# Altium footprint library 9-Pcblib_Con.PcbLib: 266 footprints (part 2 of 17)
Each footprint in its own frame and in the unit in brackets; x right, y up, seen from the top. Pads: shape width x height; smd on the part's side, far side on the other; paste and mask are expansions set on the pad; w line width, h text height; cw(c..) or ccw(c..) is an arc to the next point about the centre after c.
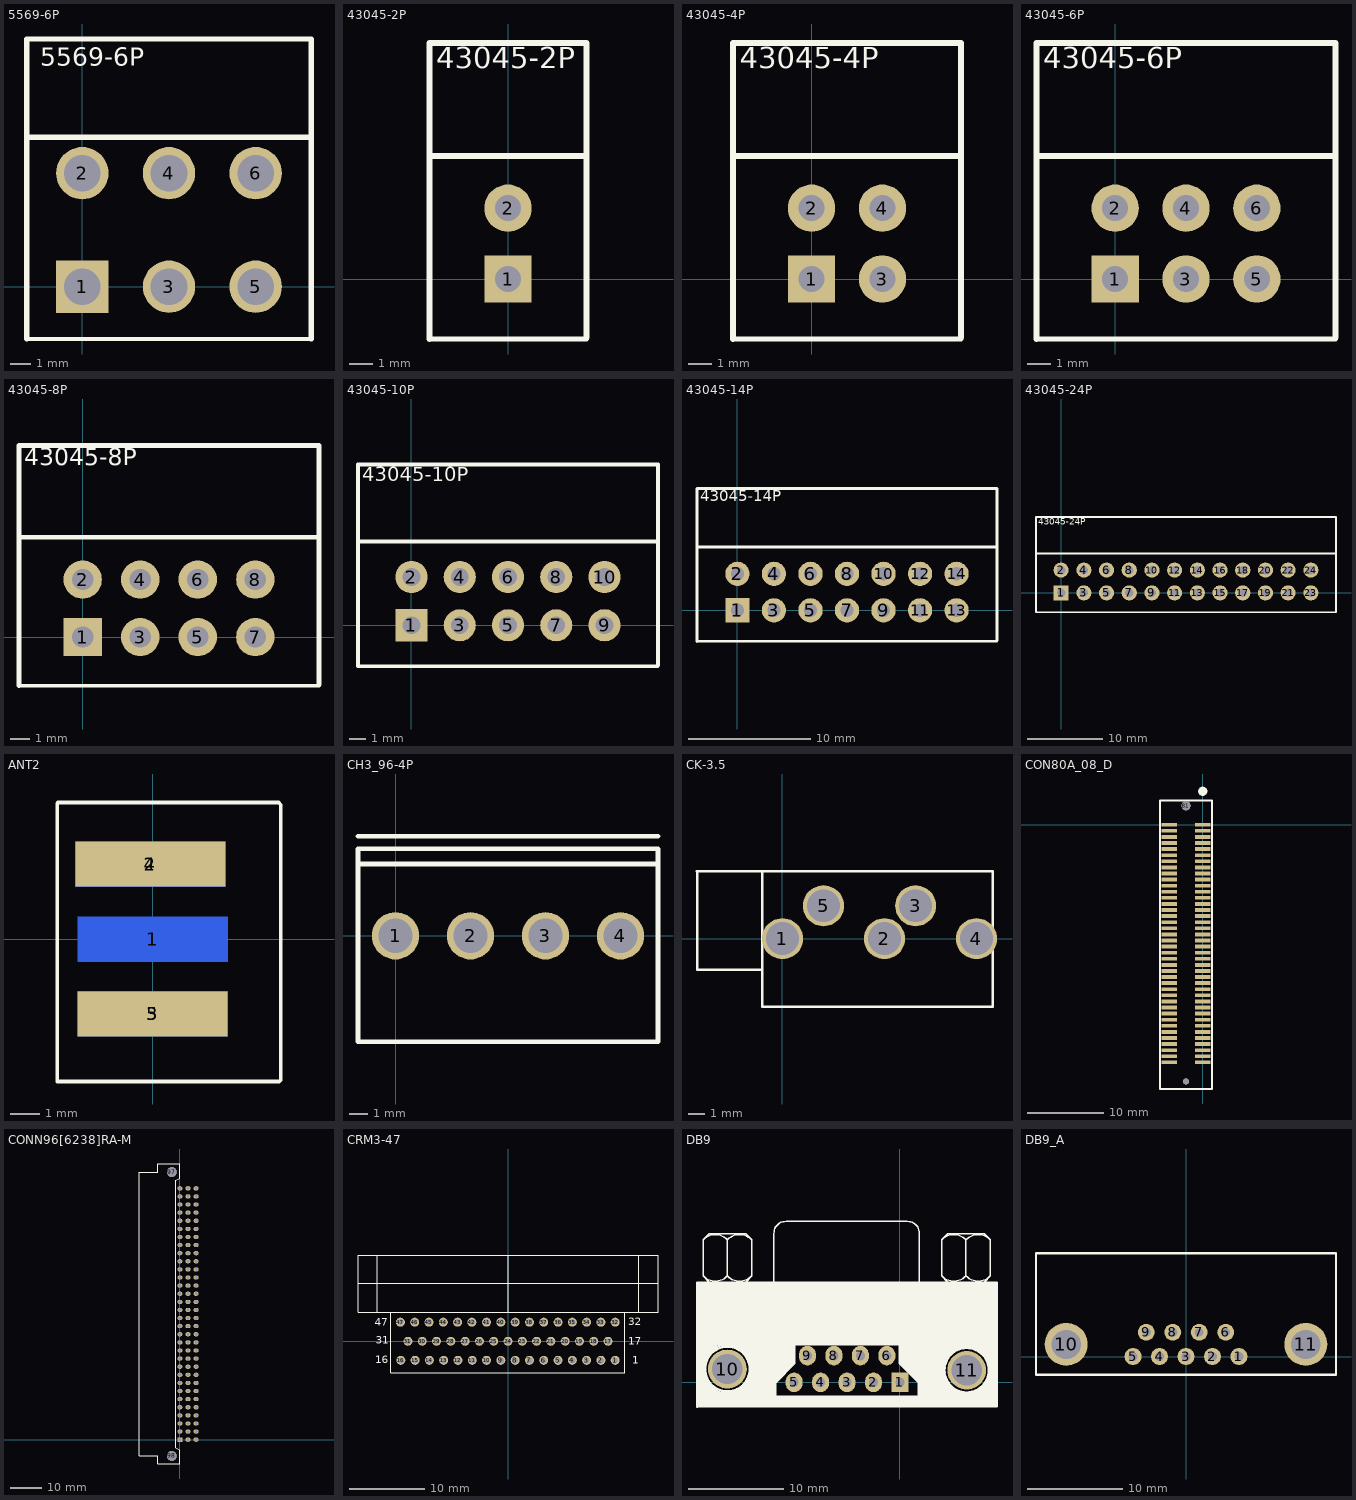
[diagram p1: the footprints below, top view; thin cyan lines are the x and y axes]

## 5569-6P [mm]
height 20
pads (6):
  rect 2.54x2.54 hole 1.778: 1(0,0)
  round 2.54 hole 1.778: 2(0,5.5) 3(4.2,0) 4(4.2,5.5) 5(8.4,0) 6(8.4,5.5)
Top Overlay:
  lines w0.2: -2.7,-2.54 11.1,-2.54
  lines w0.254: -2.7,-2.54 -2.7,12 11.1,12 11.1,-2.54 ; -2.7,7.239 10.973,7.239
  text "5569-6P" at -2.032,10.414 h1.52

## 43045-2P [mm]
height 25
pads (2):
  rect 2x2 hole 1.1: 1(0,0)
  round 2 hole 1.1: 2(0,3)
Top Overlay:
  lines w0.2: -3.325,-2.54 3.325,-2.54
  lines w0.254: -3.325,-2.54 -3.325,10 3.325,10 3.325,-2.475 ; -3.325,5.207 3.325,5.207
  text "43045-2P" at -3.048,8.636 h1.52

## 43045-4P [mm]
height 25
pads (4):
  rect 2x2 hole 1.1: 1(0,0)
  round 2 hole 1.1: 2(0,3) 3(3,0) 4(3,3)
Top Overlay:
  lines w0.2: -3.325,-2.54 6.325,-2.54
  lines w0.254: -3.325,-2.54 -3.325,10 6.325,10 6.325,-2.475 ; -3.325,5.207 6.325,5.207
  text "43045-4P" at -3.048,8.636 h1.52

## 43045-6P [mm]
height 25
pads (6):
  rect 2x2 hole 1.1: 1(0,0)
  round 2 hole 1.1: 2(0,3) 3(3,0) 4(3,3) 5(6,0) 6(6,3)
Top Overlay:
  lines w0.2: -3.325,-2.54 9.325,-2.54
  lines w0.254: -3.325,-2.54 -3.325,10 9.325,10 9.325,-2.475 ; -3.325,5.207 9.325,5.207
  text "43045-6P" at -3.048,8.636 h1.52

## 43045-8P [mm]
height 25
pads (8):
  rect 2x2 hole 1.1: 1(0,0)
  round 2 hole 1.1: 2(0,3) 3(3,0) 4(3,3) 5(6,0) 6(6,3) 7(9,0) 8(9,3)
Top Overlay:
  lines w0.2: -3.325,-2.54 12.325,-2.54
  lines w0.254: -3.325,-2.54 -3.325,10 12.325,10 12.325,-2.475 ; -3.325,5.207 12.325,5.207
  text "43045-8P" at -3.048,8.636 h1.52

## 43045-10P [mm]
height 25
pads (10):
  rect 2x2 hole 1.1: 1(0,0)
  round 2 hole 1.1: 2(0,3) 3(3,0) 4(3,3) 5(6,0) 6(6,3) 7(9,0) 8(9,3) 9(12,0) 10(12,3)
Top Overlay:
  lines w0.2: -3.325,-2.54 15.325,-2.54
  lines w0.254: -3.325,-2.54 -3.325,10 15.325,10 15.325,-2.475 ; -3.325,5.207 15.325,5.207
  text "43045-10P" at -3.048,8.636 h1.52

## 43045-14P [mm]
height 25
pads (14):
  rect 2x2 hole 1.1: 1(0,0)
  round 2 hole 1.1: 2(0,3) 3(3,0) 4(3,3) 5(6,0) 6(6,3) 7(9,0) 8(9,3) 9(12,0) 10(12,3) 11(15,0) 12(15,3) 13(18,0) 14(18,3)
Top Overlay:
  lines w0.2: -3.325,-2.54 21.325,-2.54
  lines w0.254: -3.325,-2.54 -3.325,10 21.325,10 21.325,-2.475 ; -3.325,5.207 21.325,5.207
  text "43045-14P" at -3.048,8.636 h1.52

## 43045-24P [mm]
height 25
pads (24):
  rect 2x2 hole 1.1: 1(0,0)
  round 2 hole 1.1: 2(0,3) 3(3,0) 4(3,3) 5(6,0) 6(6,3) 7(9,0) 8(9,3) 9(12,0) 10(12,3) 11(15,0) 12(15,3) 13(18,0) 14(18,3) 15(21,0) 16(21,3) 17(24,0) 18(24,3) 19(27,0) 20(27,3) 21(30,0) 22(30,3) 23(33,0) 24(33,3)
Top Overlay:
  lines w0.2: -3.325,-2.54 36.325,-2.54
  lines w0.254: -3.325,-2.54 -3.325,10 36.325,10 36.325,-2.475 ; -3.325,5.207 36.325,5.207
  text "43045-24P" at -3.048,8.636 h1.52

## ANT2 [mil]
pads (5):
  rect 200x60 smd far side: 1(0,0) 4(-3,100) 5(0,-100)
  rect 200x60 smd: 2(-3,100) 3(0,-100)
Top Overlay:
  lines w5: 171,-186 171,-157 ; 171,-183 171,-188 169,-190 -127,-190 -127,-159 -127,181 -126,182 168,182 171,179 171,-159

## CH3_96-4P [mm]
pads (4):
  round 2.5 hole 1.8: 1(0,0) 2(3.96,0) 3(7.92,0) 4(11.88,0)
Top Overlay:
  lines w0.254: -1.98,3.787 13.86,3.787 ; -1.98,5.26 13.86,5.26 ; -1.98,-5.6 13.86,-5.6 13.86,4.6 -1.98,4.6 -1.98,-5.6
3D body: height 13.8, standoff -3.6, extent -1.926,-5.664 13.914,4.736

## CK-3.5 [mm]
pads (5):
  round 2.5 hole 2: 1(0,0) 2(6.2,0) 3(8.1,2) 4(11.8,0) 5(2.5,2)
Top Overlay:
  lines w0.152: -5.2,4.1 -1.2,4.1 12.8,4.1 ; -5.182,4.1 -5.182,-1.9 -1.3,-1.9 -1.295,-1.905 ; -1.219,-4.14 12.8,-4.14 12.8,4.076 12.776,4.1 ; -1.219,-4.1 -1.219,4.1

## CON80A_08_D [mm]
pads (82):
  rect 2x0.5 smd: 1(0,0) 2(-4.4,0) 3(0,-0.8) 4(-4.4,-0.8) 5(0,-1.6) 6(-4.4,-1.6) 7(0,-2.4) 8(-4.4,-2.4) 9(0,-3.2) 10(-4.4,-3.2) 11(0,-4) 12(-4.4,-4) 13(0,-4.8) 14(-4.4,-4.8) 15(0,-5.6) 16(-4.4,-5.6) 17(0,-6.4) 18(-4.4,-6.4) 19(0,-7.2) 20(-4.4,-7.2) 21(0,-8) 22(-4.4,-8) 23(0,-8.8) 24(-4.4,-8.8) 25(0,-9.6) 26(-4.4,-9.6) 27(0,-10.4) 28(-4.4,-10.4) 29(0,-11.2) 30(-4.4,-11.2) 31(0,-12) 32(-4.4,-12) 33(0,-12.8) 34(-4.4,-12.8) 35(0,-13.6) 36(-4.4,-13.6) 37(0,-14.4) 38(-4.4,-14.4) 39(0,-15.2) 40(-4.4,-15.2) 41(0,-16) 42(-4.4,-16) 43(0,-16.8) 44(-4.4,-16.8) 45(0,-17.6) 46(-4.4,-17.6) 47(0,-18.4) 48(-4.4,-18.4) 49(0,-19.2) 50(-4.4,-19.2) 51(0,-20) 52(-4.4,-20) 53(0,-20.8) 54(-4.4,-20.8) 55(0,-21.6) 56(-4.4,-21.6) 57(0,-22.4) 58(-4.4,-22.4) 59(0,-23.2) 60(-4.4,-23.2) 61(0,-24) 62(-4.4,-24) 63(0,-24.8) 64(-4.4,-24.8) 65(0,-25.6) 66(-4.4,-25.6) 67(0,-26.4) 68(-4.4,-26.4) 69(0,-27.2) 70(-4.4,-27.2) 71(0,-28) 72(-4.4,-28) 73(0,-28.8) 74(-4.4,-28.8) 75(0,-29.6) 76(-4.4,-29.6) 77(0,-30.4) 78(-4.4,-30.4) 79(0,-31.2) 80(-4.4,-31.2)
  round 1.2 hole 1.2 unplated: 81(-2.2,2.5)
  round 0.8 hole 0.8 unplated: 82(-2.2,-33.7)
Top Overlay:
  circle w0.6: c0,4.392 r0.3
  lines w0.254: -5.6,-34.7 -5.6,3.2 1.2,3.2 1.2,-34.7 -5.6,-34.7

## CONN96[6238]RA-M [mil]
pads (98):
  round 120 hole 120 unplated: 97(-100,3300) 98(-100,-200)
  rect 62x51.18 hole 42: A1(0,0)
  oval 62x51.18 hole 42: A2(0,100) A3(0,200) A4(0,300) A5(0,400) A6(0,500) A7(0,600) A8(0,700) A9(0,800) A10(0,900) A11(0,1000) A12(0,1100) A13(0,1200) A14(0,1300) A15(0,1400) A16(0,1500) A17(0,1600) A18(0,1700) A19(0,1800) A20(0,1900) A21(0,2000) A22(0,2100) A23(0,2200) A24(0,2300) A25(0,2400) A26(0,2500) A27(0,2600) A28(0,2700) A29(0,2800) A30(0,2900) A31(0,3000) A32(0,3100) B1(100,0) B2(100,100) B3(100,200) B4(100,300) B5(100,400) B6(100,500) B7(100,600) B8(100,700) B9(100,800) B10(100,900) B11(100,1000) B12(100,1100) B13(100,1200) B14(100,1300) B15(100,1400) B16(100,1500) B17(100,1600) B18(100,1700) B19(100,1800) B20(100,1900) B21(100,2000) B22(100,2100) B23(100,2200) B24(100,2300) B25(100,2400) B26(100,2500) B27(100,2600) B28(100,2700) B29(100,2800) B30(100,2900) B31(100,3000) B32(100,3100) C1(200,0) C2(200,100) C3(200,200) C4(200,300) C5(200,400) C6(200,500) C7(200,600) C8(200,700) C9(200,800) C10(200,900) C11(200,1000) C12(200,1100) C13(200,1200) C14(200,1300) C15(200,1400) C16(200,1500) C17(200,1600) C18(200,1700) C19(200,1800) C20(200,1900) C21(200,2000) C22(200,2100) C23(200,2200) C24(200,2300) C25(200,2400) C26(200,2500) C27(200,2600) C28(200,2700) C29(200,2800) C30(200,2900) C31(200,3000) C32(200,3100)
Top Overlay:
  lines w10: -500,-200 -500,3300 -275,3300 -275,3400 0,3400 0,3225 -50,3200 -50,-100 0,-125 0,-300 -275,-300 -275,-200 -500,-200

## CRM3-47 [mm]
pads (47):
  round 1.2 hole 0.8: 1(14.287,-2.54) 2(12.383,-2.54) 3(10.477,-2.54) 4(8.572,-2.54) 5(6.667,-2.54) 6(4.763,-2.54) 7(2.857,-2.54) 8(0.952,-2.54) 9(-0.953,-2.54) 10(-2.857,-2.54) 11(-4.763,-2.54) 12(-6.667,-2.54) 13(-8.572,-2.54) 14(-10.477,-2.54) 15(-12.383,-2.54) 16(-14.287,-2.54) 17(13.335,0) 18(11.43,0) 19(9.525,0) 20(7.62,0) 21(5.715,0) 22(3.81,0) 23(1.905,0) 24(0,0) 25(-1.905,0) 26(-3.81,0) 27(-5.715,0) 28(-7.62,0) 29(-9.525,0) 30(-11.43,0) 31(-13.335,0) 32(14.287,2.54) 33(12.383,2.54) 34(10.477,2.54) 35(8.572,2.54) 36(6.667,2.54) 37(4.763,2.54) 38(2.857,2.54) 39(0.953,2.54) 40(-0.953,2.54) 41(-2.857,2.54) 42(-4.813,2.54) 43(-6.718,2.54) 44(-8.623,2.54) 45(-10.528,2.54) 46(-12.433,2.54) 47(-14.338,2.54)
Top Layer:
  lines w0.127: -17.45,11.481 0,11.481
Top Overlay:
  lines w0.127: -19.99,7.722 0,7.722 19.99,7.722 ; -15.596,3.861 -15.596,-4.216 0,-4.216 15.57,-4.216 15.57,3.861 ; -17.45,3.861 -17.45,11.481 ; -17.45,3.861 -17.45,11.481 ; -17.45,3.861 -19.99,3.861 -19.99,11.481 -17.45,11.481 ; -17.45,3.861 0,3.861 ; -17.45,11.481 0,11.481 ; 0,3.861 17.45,3.861 17.45,11.481 ; 0,3.861 19.99,3.861 19.99,11.481 17.45,11.481 ; 0,3.861 0,11.481 ; 0,11.481 17.45,11.481
  text "16" at -17.704,-2.946 h1
  text "31" at -17.602,-0.33 h1
  text "1" at 16.586,-3.023 h1
  text "17" at 16.002,-0.457 h1
  text "32" at 16.027,2.159 h1
  text "47" at -17.755,2.083 h1

## DB9 [mil]
pads (11):
  rect 70x80 hole 38: 1(0,0)
  oval 70x80 hole 38: 2(-109,0) 3(-218,0) 4(-327,0) 5(-436,0) 6(-54,110) 7(-163,110) 8(-272,110) 9(-381,110)
  round 160 hole 125: 10(-711,55) 11(275,50)
Top Overlay:
  circle w11.81: c-711,55 r92.64
  circle w11.81: c-711,55 r102.48
  circle w11.81: c-711,55 r112.33
  circle w11.81: c-711,55 r122.17
  circle w11.81: c275,50 r92.64
  circle w11.81: c275,50 r102.48
  circle w11.81: c275,50 r112.33
  circle w11.81: c275,50 r122.17
  rectangle: -836.27,-100.01 -808.82,9.83
  rectangle: -818.66,-100.01 -789.14,-19.69
  rectangle: -798.71,-100 -769.18,-39.37
  rectangle: -769.45,-100.01 -749.77,-39.38
  rectangle: -749.5,-100 -513.28,-39.37
  rectangle: -513.27,-100 77.28,-59.05
  rectangle: 77.01,-100.01 399.73,-59.06
  rectangle: 333.18,-78.74 400,-29.53
  rectangle: 372.28,-39.38 399.73,9.83
  rectangle: -1.73,78.73 185.27,157.47
  rectangle: 77.28,-68.9 185.54,88.58
  rectangle: 175.43,-68.91 214.8,-29.54
  rectangle: 17.95,59.05 77.01,88.57
  rectangle: 37.64,39.36 77.01,59.05
  rectangle: 57.59,19.69 77.28,39.37
  rectangle: -611.97,-39.38 -513.55,157.47
  rectangle: -631.39,-59.05 -592.02,-19.68
  rectangle: -641.5,127.94 -572.6,177.16
  rectangle: -700.28,157.48 -641.23,177.17
  rectangle: -572.6,78.73 -434.81,177.16
  rectangle: -523.12,39.37 -473.91,78.74
  rectangle: -523.39,19.4 -494.14,39.36
  rectangle: -473.91,59.06 -454.22,78.74
  rectangle: -836,157.48 400,410
  rectangle: -836,88.58 -808.55,157.48
  rectangle: -808.55,137.8 -788.87,157.48
  rectangle: -798.71,147.64 -769.18,177.17
  rectangle: -836.27,118.1 -798.98,157.47
  rectangle: 165.59,127.94 214.8,167.31
  rectangle: 342.75,118.1 399.73,167.31
  rectangle: 372.55,78.74 400,127.95
  rectangle: 6.14,74.79 14.01,82.67
  rectangle: 2.2,74.79 10.08,82.67
  rectangle: 6.14,70.86 21.89,82.67
  rectangle: 10.08,62.98 21.89,74.79
  rectangle: 21.89,51.17 41.57,62.98
  rectangle: 30.03,47.24 45.78,51.18
  rectangle: 33.7,43.3 41.57,51.17
  rectangle: 41.84,31.5 61.53,43.31
  rectangle: 49.45,23.61 65.19,35.42
  rectangle: 61.26,15.74 80.94,23.61
  rectangle: 65.19,7.86 80.94,19.68
  rectangle: 73.34,3.94 81.21,11.81
  rectangle: -462.36,62.98 -450.55,82.67
  rectangle: -454.49,70.86 -442.68,82.67
  rectangle: -454.22,66.93 -446.35,74.8
  rectangle: -446.35,74.8 -438.47,82.68
  rectangle: -477.84,43.31 -469.97,62.99
  rectangle: -474.18,47.23 -466.3,66.92
  rectangle: -469.97,51.18 -458.16,66.93
  rectangle: -497.53,23.62 -489.65,43.31
  rectangle: -493.59,27.56 -485.72,47.24
  rectangle: -489.65,31.5 -481.78,47.24
  rectangle: -485.72,35.43 -477.84,43.31
  rectangle: -517.21,3.94 -509.34,23.62
  rectangle: -513.54,7.86 -505.67,23.61
  rectangle: -509.34,11.81 -497.53,23.62
  lines w6: -836.09,413.35 397.24,413.35 ; -811.17,438.27 ccw(c-761.09,488.35) -711,438.27 ; -811.17,588.44 cw(c-761.09,538.35) -711,588.44 ; -786.09,413.35 -811.09,438.35 -811.09,588.35 -786.09,613.35 -636.09,613.35 -611.09,588.35 -611.09,438.35 -636.09,413.35 ; -711.17,438.27 ccw(c-661.09,488.35) -611,438.27 ; -711.17,588.44 cw(c-661.09,538.35) -611,588.44 ; -711.09,438.35 -711.09,588.35 ; -519.42,413.35 -519.42,613.35 cw(c-469.42,613.35) -469.42,663.35 30.58,663.35 cw(c30.58,613.35) 80.58,613.35 80.58,413.35 ; 172.16,438.27 ccw(c222.24,488.35) 272.33,438.27 ; 172.16,588.44 cw(c222.24,538.35) 272.33,588.44 ; 197.24,413.35 172.24,438.35 172.24,588.35 197.24,613.35 347.24,613.35 372.24,588.35 372.24,438.35 347.24,413.35 ; 272.16,438.27 ccw(c322.24,488.35) 372.33,438.27 ; 272.16,588.44 cw(c322.24,538.35) 372.33,588.44 ; 272.24,438.35 272.24,588.35
  lines w8: -836,-100 400,-100 400,410
  lines w10: -836,-100 -836,410 400,410 ; -513.28,-59.05 -218,-59.05 77.28,-59.05 77.28,0 -1.47,78.74 -1.47,157.48 -434.54,157.48 -434.54,78.74 -513.28,0 -513.28,-59.05

## DB9_A [mil]
pads (11):
  round 70 hole 37: 1(218.11,0) 2(109.06,0) 3(0,0) 4(-109.06,0) 5(-218.11,0) 6(163.58,100) 7(54.53,100) 8(-54.53,100) 9(-163.58,100)
  round 177 hole 120: 10(-493.7,50) 11(493.7,50)
Top Overlay:
  lines w10: -618.11,-74.8 618.11,-74.8 618.11,425.2 -618.11,425.2 -618.11,-74.8
3D body: height 507.05, standoff -139.61, extent -606.29,-65.98 606.3,658.43